# Altium footprint library con-samtec.PCBLIB: 805 footprints (part 35 of 55)
Each footprint in its own frame and in the unit in brackets; x right, y up, seen from the top. Pads: shape width x height; smd on the part's side, far side on the other; paste and mask are expansions set on the pad; w line width, h text height; cw(c..) or ccw(c..) is an arc to the next point about the centre after c.
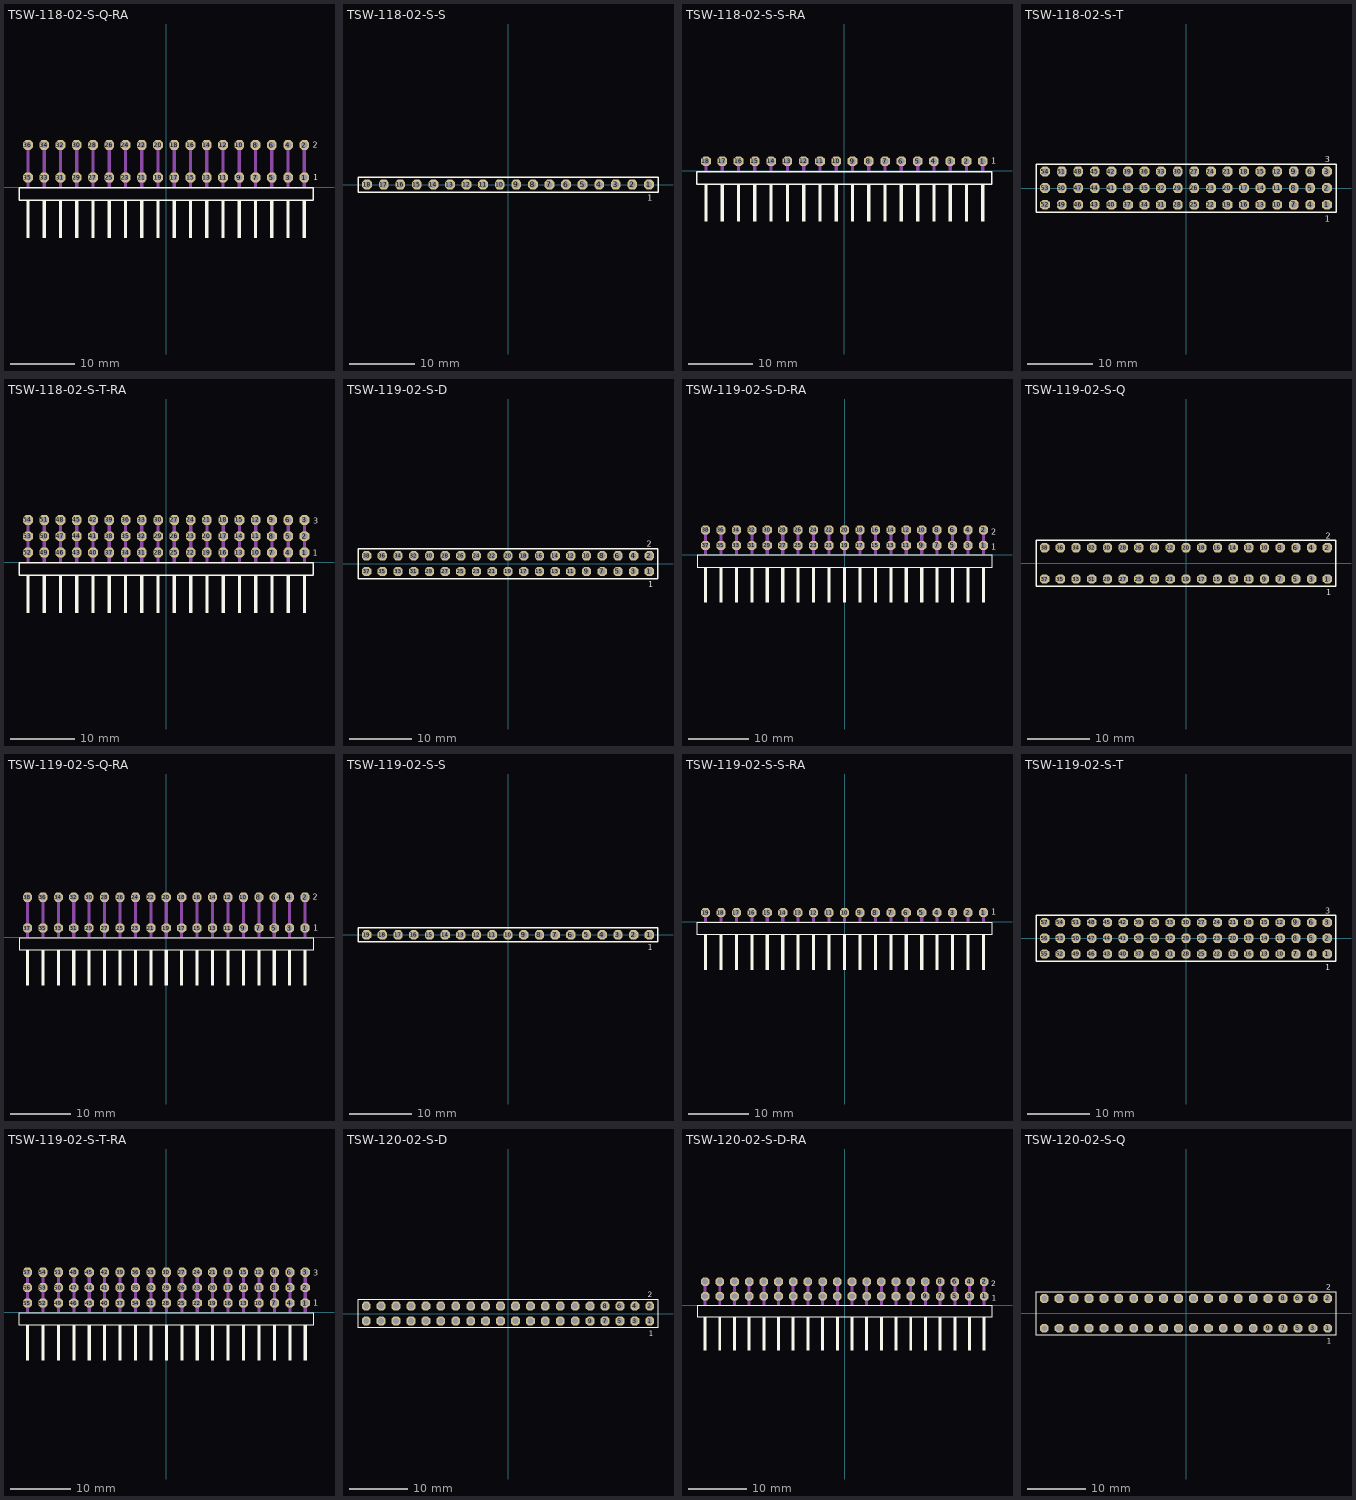
[diagram p34: the footprints below, top view; thin cyan lines are the x and y axes]

## TSW-118-02-S-Q-RA [mil]
pads (36):
  oct 59.06x59.06 hole 39.37: 1(850,60) 2(850,260) 3(750,60) 4(750,260) 5(650,60) 6(650,260) 7(550,60) 8(550,260) 9(450,60) 10(450,260) 11(350,60) 12(350,260) 13(250,60) 14(250,260) 15(150,60) 16(150,260) 17(50,60) 18(50,260) 19(-50,60) 20(-50,260) 21(-150,60) 22(-150,260) 23(-250,60) 24(-250,260) 25(-350,60) 26(-350,260) 27(-450,60) 28(-450,260) 29(-550,60) 30(-550,260) 31(-650,60) 32(-650,260) 33(-750,60) 34(-750,260) 35(-850,60) 36(-850,260)
Top Overlay:
  rectangle: -860,-310.63 -840,-80.32
  rectangle: -760,-310.63 -740,-80.32
  rectangle: -660,-310.63 -640,-80.32
  rectangle: -560,-310.63 -540,-80.32
  rectangle: -460,-310.63 -440,-80.32
  rectangle: -360,-310.63 -340,-80.32
  rectangle: -260,-310.63 -240,-80.32
  rectangle: -160,-310.63 -140,-80.32
  rectangle: -60,-310.63 -40,-80.32
  rectangle: 40,-310.63 60,-80.32
  rectangle: 140,-310.63 160,-80.32
  rectangle: 240,-310.63 260,-80.32
  rectangle: 340,-310.63 360,-80.32
  rectangle: 440,-310.63 460,-80.32
  rectangle: 540,-310.63 560,-80.32
  rectangle: 640,-310.63 660,-80.32
  rectangle: 740,-310.63 760,-80.32
  rectangle: 840,-310.63 860,-80.32
  lines w8: -905.08,-80.55 905.08,-80.55 905.08,-4.17 -905.08,-4.17 -905.08,-80.55
  text "1" at 903.54,43.31 h36.81
  text "2" at 901.18,242.72 h36.81
Mechanical 16:
  rectangle: -860,0 -840,270
  rectangle: -760,0 -740,270
  rectangle: -660,0 -640,270
  rectangle: -560,0 -540,270
  rectangle: -460,0 -440,270
  rectangle: -360,0 -340,270
  rectangle: -260,0 -240,270
  rectangle: -160,0 -140,270
  rectangle: -60,0 -40,270
  rectangle: 40,0 60,270
  rectangle: 140,0 160,270
  rectangle: 240,0 260,270
  rectangle: 340,0 360,270
  rectangle: 440,0 460,270
  rectangle: 540,0 560,270
  rectangle: 640,0 660,270
  rectangle: 740,0 760,270
  rectangle: 840,0 860,270

## TSW-118-02-S-S [mm]
pads (18):
  oct 1.5x1.5 hole 1: 1(21.59,0) 2(19.05,0) 3(16.51,0) 4(13.97,0) 5(11.43,0) 6(8.89,0) 7(6.35,0) 8(3.81,0) 9(1.27,0) 10(-1.27,0) 11(-3.81,0) 12(-6.35,0) 13(-8.89,0) 14(-11.43,0) 15(-13.97,0) 16(-16.51,0) 17(-19.05,0) 18(-21.59,0)
Top Overlay:
  lines w0.203: -22.989,-1.155 22.989,-1.155 22.989,1.155 -22.989,1.155 -22.989,-1.155
  text "1" at 21.332,-2.498 h0.94
Mechanical 16:
  rectangle: -21.94,-0.35 -21.24,0.35
  rectangle: -19.4,-0.35 -18.7,0.35
  rectangle: -16.86,-0.35 -16.16,0.35
  rectangle: -14.32,-0.35 -13.62,0.35
  rectangle: -11.78,-0.35 -11.08,0.35
  rectangle: -9.24,-0.35 -8.54,0.35
  rectangle: -6.7,-0.35 -6,0.35
  rectangle: -4.16,-0.35 -3.46,0.35
  rectangle: -1.62,-0.35 -0.92,0.35
  rectangle: 0.92,-0.35 1.62,0.35
  rectangle: 3.46,-0.35 4.16,0.35
  rectangle: 6,-0.35 6.7,0.35
  rectangle: 8.54,-0.35 9.24,0.35
  rectangle: 11.08,-0.35 11.78,0.35
  rectangle: 13.62,-0.35 14.32,0.35
  rectangle: 16.16,-0.35 16.86,0.35
  rectangle: 18.7,-0.35 19.4,0.35
  rectangle: 21.24,-0.35 21.94,0.35

## TSW-118-02-S-S-RA [mil]
pads (18):
  oct 59.06x59.06 hole 39.37: 1(850,60) 2(750,60) 3(650,60) 4(550,60) 5(450,60) 6(350,60) 7(250,60) 8(150,60) 9(50,60) 10(-50,60) 11(-150,60) 12(-250,60) 13(-350,60) 14(-450,60) 15(-550,60) 16(-650,60) 17(-750,60) 18(-850,60)
Top Overlay:
  rectangle: -860,-310.63 -840,-80.32
  rectangle: -760,-310.63 -740,-80.32
  rectangle: -660,-310.63 -640,-80.32
  rectangle: -560,-310.63 -540,-80.32
  rectangle: -460,-310.63 -440,-80.32
  rectangle: -360,-310.63 -340,-80.32
  rectangle: -260,-310.63 -240,-80.32
  rectangle: -160,-310.63 -140,-80.32
  rectangle: -60,-310.63 -40,-80.32
  rectangle: 40,-310.63 60,-80.32
  rectangle: 140,-310.63 160,-80.32
  rectangle: 240,-310.63 260,-80.32
  rectangle: 340,-310.63 360,-80.32
  rectangle: 440,-310.63 460,-80.32
  rectangle: 540,-310.63 560,-80.32
  rectangle: 640,-310.63 660,-80.32
  rectangle: 740,-310.63 760,-80.32
  rectangle: 840,-310.63 860,-80.32
  lines w8: -905.08,-80.55 905.08,-80.55 905.08,-4.17 -905.08,-4.17 -905.08,-80.55
  text "1" at 900.47,45.35 h36.81
Mechanical 16:
  rectangle: -860,0 -840,70
  rectangle: -760,0 -740,70
  rectangle: -660,0 -640,70
  rectangle: -560,0 -540,70
  rectangle: -460,0 -440,70
  rectangle: -360,0 -340,70
  rectangle: -260,0 -240,70
  rectangle: -160,0 -140,70
  rectangle: -60,0 -40,70
  rectangle: 40,0 60,70
  rectangle: 140,0 160,70
  rectangle: 240,0 260,70
  rectangle: 340,0 360,70
  rectangle: 440,0 460,70
  rectangle: 540,0 560,70
  rectangle: 640,0 660,70
  rectangle: 740,0 760,70
  rectangle: 840,0 860,70

## TSW-118-02-S-T [mm]
pads (54):
  oct 1.5x1.5 hole 1: 1(21.59,-2.54) 2(21.59,0) 3(21.59,2.54) 4(19.05,-2.54) 5(19.05,0) 6(19.05,2.54) 7(16.51,-2.54) 8(16.51,0) 9(16.51,2.54) 10(13.97,-2.54) 11(13.97,0) 12(13.97,2.54) 13(11.43,-2.54) 14(11.43,0) 15(11.43,2.54) 16(8.89,-2.54) 17(8.89,0) 18(8.89,2.54) 19(6.35,-2.54) 20(6.35,0) 21(6.35,2.54) 22(3.81,-2.54) 23(3.81,0) 24(3.81,2.54) 25(1.27,-2.54) 26(1.27,0) 27(1.27,2.54) 28(-1.27,-2.54) 29(-1.27,0) 30(-1.27,2.54) 31(-3.81,-2.54) 32(-3.81,0) 33(-3.81,2.54) 34(-6.35,-2.54) 35(-6.35,0) 36(-6.35,2.54) 37(-8.89,-2.54) 38(-8.89,0) 39(-8.89,2.54) 40(-11.43,-2.54) 41(-11.43,0) 42(-11.43,2.54) 43(-13.97,-2.54) 44(-13.97,0) 45(-13.97,2.54) 46(-16.51,-2.54) 47(-16.51,0) 48(-16.51,2.54) 49(-19.05,-2.54) 50(-19.05,0) 51(-19.05,2.54) 52(-21.59,-2.54) 53(-21.59,0) 54(-21.59,2.54)
Top Overlay:
  lines w0.203: -22.989,-3.695 22.989,-3.695 22.989,3.695 -22.989,3.695 -22.989,-3.695
  text "1" at 21.282,-5.188 h0.94
  text "3" at 21.278,3.989 h0.94
Mechanical 16:
  rectangle: -21.94,-2.89 -21.24,-2.19
  rectangle: -21.94,-0.35 -21.24,0.35
  rectangle: -21.94,2.19 -21.24,2.89
  rectangle: -19.4,-2.89 -18.7,-2.19
  rectangle: -19.4,-0.35 -18.7,0.35
  rectangle: -19.4,2.19 -18.7,2.89
  rectangle: -16.86,-2.89 -16.16,-2.19
  rectangle: -16.86,-0.35 -16.16,0.35
  rectangle: -16.86,2.19 -16.16,2.89
  rectangle: -14.32,-2.89 -13.62,-2.19
  rectangle: -14.32,-0.35 -13.62,0.35
  rectangle: -14.32,2.19 -13.62,2.89
  rectangle: -11.78,-2.89 -11.08,-2.19
  rectangle: -11.78,-0.35 -11.08,0.35
  rectangle: -11.78,2.19 -11.08,2.89
  rectangle: -9.24,-2.89 -8.54,-2.19
  rectangle: -9.24,-0.35 -8.54,0.35
  rectangle: -9.24,2.19 -8.54,2.89
  rectangle: -6.7,-2.89 -6,-2.19
  rectangle: -6.7,-0.35 -6,0.35
  rectangle: -6.7,2.19 -6,2.89
  rectangle: -4.16,-2.89 -3.46,-2.19
  rectangle: -4.16,-0.35 -3.46,0.35
  rectangle: -4.16,2.19 -3.46,2.89
  rectangle: -1.62,-2.89 -0.92,-2.19
  rectangle: -1.62,-0.35 -0.92,0.35
  rectangle: -1.62,2.19 -0.92,2.89
  rectangle: 0.92,-2.89 1.62,-2.19
  rectangle: 0.92,-0.35 1.62,0.35
  rectangle: 0.92,2.19 1.62,2.89
  rectangle: 3.46,-2.89 4.16,-2.19
  rectangle: 3.46,-0.35 4.16,0.35
  rectangle: 3.46,2.19 4.16,2.89
  rectangle: 6,-2.89 6.7,-2.19
  rectangle: 6,-0.35 6.7,0.35
  rectangle: 6,2.19 6.7,2.89
  rectangle: 8.54,-2.89 9.24,-2.19
  rectangle: 8.54,-0.35 9.24,0.35
  rectangle: 8.54,2.19 9.24,2.89
  rectangle: 11.08,-2.89 11.78,-2.19
  rectangle: 11.08,-0.35 11.78,0.35
  rectangle: 11.08,2.19 11.78,2.89
  rectangle: 13.62,-2.89 14.32,-2.19
  rectangle: 13.62,-0.35 14.32,0.35
  rectangle: 13.62,2.19 14.32,2.89
  rectangle: 16.16,-2.89 16.86,-2.19
  rectangle: 16.16,-0.35 16.86,0.35
  rectangle: 16.16,2.19 16.86,2.89
  rectangle: 18.7,-2.89 19.4,-2.19
  rectangle: 18.7,-0.35 19.4,0.35
  rectangle: 18.7,2.19 19.4,2.89
  rectangle: 21.24,-2.89 21.94,-2.19
  rectangle: 21.24,-0.35 21.94,0.35
  rectangle: 21.24,2.19 21.94,2.89

## TSW-118-02-S-T-RA [mil]
pads (54):
  oct 59.06x59.06 hole 39.37: 1(850,60) 2(850,160) 3(850,260) 4(750,60) 5(750,160) 6(750,260) 7(650,60) 8(650,160) 9(650,260) 10(550,60) 11(550,160) 12(550,260) 13(450,60) 14(450,160) 15(450,260) 16(350,60) 17(350,160) 18(350,260) 19(250,60) 20(250,160) 21(250,260) 22(150,60) 23(150,160) 24(150,260) 25(50,60) 26(50,160) 27(50,260) 28(-50,60) 29(-50,160) 30(-50,260) 31(-150,60) 32(-150,160) 33(-150,260) 34(-250,60) 35(-250,160) 36(-250,260) 37(-350,60) 38(-350,160) 39(-350,260) 40(-450,60) 41(-450,160) 42(-450,260) 43(-550,60) 44(-550,160) 45(-550,260) 46(-650,60) 47(-650,160) 48(-650,260) 49(-750,60) 50(-750,160) 51(-750,260) 52(-850,60) 53(-850,160) 54(-850,260)
Top Overlay:
  rectangle: -860,-310.63 -840,-80.32
  rectangle: -760,-310.63 -740,-80.32
  rectangle: -660,-310.63 -640,-80.32
  rectangle: -560,-310.63 -540,-80.32
  rectangle: -460,-310.63 -440,-80.32
  rectangle: -360,-310.63 -340,-80.32
  rectangle: -260,-310.63 -240,-80.32
  rectangle: -160,-310.63 -140,-80.32
  rectangle: -60,-310.63 -40,-80.32
  rectangle: 40,-310.63 60,-80.32
  rectangle: 140,-310.63 160,-80.32
  rectangle: 240,-310.63 260,-80.32
  rectangle: 340,-310.63 360,-80.32
  rectangle: 440,-310.63 460,-80.32
  rectangle: 540,-310.63 560,-80.32
  rectangle: 640,-310.63 660,-80.32
  rectangle: 740,-310.63 760,-80.32
  rectangle: 840,-310.63 860,-80.32
  lines w8: -905.08,-80.55 905.08,-80.55 905.08,-4.17 -905.08,-4.17 -905.08,-80.55
  text "1" at 901.57,41.34 h36.81
  text "3" at 902.17,236.81 h36.81
Mechanical 16:
  rectangle: -860,0 -840,270
  rectangle: -760,0 -740,270
  rectangle: -660,0 -640,270
  rectangle: -560,0 -540,270
  rectangle: -460,0 -440,270
  rectangle: -360,0 -340,270
  rectangle: -260,0 -240,270
  rectangle: -160,0 -140,270
  rectangle: -60,0 -40,270
  rectangle: 40,0 60,270
  rectangle: 140,0 160,270
  rectangle: 240,0 260,270
  rectangle: 340,0 360,270
  rectangle: 440,0 460,270
  rectangle: 540,0 560,270
  rectangle: 640,0 660,270
  rectangle: 740,0 760,270
  rectangle: 840,0 860,270

## TSW-119-02-S-D [mm]
pads (38):
  oct 1.5x1.5 hole 1: 1(22.86,-1.27) 2(22.86,1.27) 3(20.32,-1.27) 4(20.32,1.27) 5(17.78,-1.27) 6(17.78,1.27) 7(15.24,-1.27) 8(15.24,1.27) 9(12.7,-1.27) 10(12.7,1.27) 11(10.16,-1.27) 12(10.16,1.27) 13(7.62,-1.27) 14(7.62,1.27) 15(5.08,-1.27) 16(5.08,1.27) 17(2.54,-1.27) 18(2.54,1.27) 19(0,-1.27) 20(0,1.27) 21(-2.54,-1.27) 22(-2.54,1.27) 23(-5.08,-1.27) 24(-5.08,1.27) 25(-7.62,-1.27) 26(-7.62,1.27) 27(-10.16,-1.27) 28(-10.16,1.27) 29(-12.7,-1.27) 30(-12.7,1.27) 31(-15.24,-1.27) 32(-15.24,1.27) 33(-17.78,-1.27) 34(-17.78,1.27) 35(-20.32,-1.27) 36(-20.32,1.27) 37(-22.86,-1.27) 38(-22.86,1.27)
Top Overlay:
  lines w0.203: -24.259,-2.425 24.259,-2.425 24.259,2.425 -24.259,2.425 -24.259,-2.425
  text "1" at 22.652,-3.818 h0.94
  text "2" at 22.477,2.744 h0.94
Mechanical 16:
  rectangle: -23.21,-1.62 -22.51,-0.92
  rectangle: -23.21,0.92 -22.51,1.62
  rectangle: -20.67,-1.62 -19.97,-0.92
  rectangle: -20.67,0.92 -19.97,1.62
  rectangle: -18.13,-1.62 -17.43,-0.92
  rectangle: -18.13,0.92 -17.43,1.62
  rectangle: -15.59,-1.62 -14.89,-0.92
  rectangle: -15.59,0.92 -14.89,1.62
  rectangle: -13.05,-1.62 -12.35,-0.92
  rectangle: -13.05,0.92 -12.35,1.62
  rectangle: -10.51,-1.62 -9.81,-0.92
  rectangle: -10.51,0.92 -9.81,1.62
  rectangle: -7.97,-1.62 -7.27,-0.92
  rectangle: -7.97,0.92 -7.27,1.62
  rectangle: -5.43,-1.62 -4.73,-0.92
  rectangle: -5.43,0.92 -4.73,1.62
  rectangle: -2.89,-1.62 -2.19,-0.92
  rectangle: -2.89,0.92 -2.19,1.62
  rectangle: -0.35,-1.62 0.35,-0.92
  rectangle: -0.35,0.92 0.35,1.62
  rectangle: 2.19,-1.62 2.89,-0.92
  rectangle: 2.19,0.92 2.89,1.62
  rectangle: 4.73,-1.62 5.43,-0.92
  rectangle: 4.73,0.92 5.43,1.62
  rectangle: 7.27,-1.62 7.97,-0.92
  rectangle: 7.27,0.92 7.97,1.62
  rectangle: 9.81,-1.62 10.51,-0.92
  rectangle: 9.81,0.92 10.51,1.62
  rectangle: 12.35,-1.62 13.05,-0.92
  rectangle: 12.35,0.92 13.05,1.62
  rectangle: 14.89,-1.62 15.59,-0.92
  rectangle: 14.89,0.92 15.59,1.62
  rectangle: 17.43,-1.62 18.13,-0.92
  rectangle: 17.43,0.92 18.13,1.62
  rectangle: 19.97,-1.62 20.67,-0.92
  rectangle: 19.97,0.92 20.67,1.62
  rectangle: 22.51,-1.62 23.21,-0.92
  rectangle: 22.51,0.92 23.21,1.62

## TSW-119-02-S-D-RA [mil]
pads (38):
  oct 59.06x59.06 hole 39.37: 1(900,60) 2(900,160) 3(800,60) 4(800,160) 5(700,60) 6(700,160) 7(600,60) 8(600,160) 9(500,60) 10(500,160) 11(400,60) 12(400,160) 13(300,60) 14(300,160) 15(200,60) 16(200,160) 17(100,60) 18(100,160) 19(0,60) 20(0,160) 21(-100,60) 22(-100,160) 23(-200,60) 24(-200,160) 25(-300,60) 26(-300,160) 27(-400,60) 28(-400,160) 29(-500,60) 30(-500,160) 31(-600,60) 32(-600,160) 33(-700,60) 34(-700,160) 35(-800,60) 36(-800,160) 37(-900,60) 38(-900,160)
Top Overlay:
  rectangle: -910,-310.63 -890,-80.32
  rectangle: -810,-310.63 -790,-80.32
  rectangle: -710,-310.63 -690,-80.32
  rectangle: -610,-310.63 -590,-80.32
  rectangle: -510,-310.63 -490,-80.32
  rectangle: -410,-310.63 -390,-80.32
  rectangle: -310,-310.63 -290,-80.32
  rectangle: -210,-310.63 -190,-80.32
  rectangle: -110,-310.63 -90,-80.32
  rectangle: -10,-310.63 10,-80.32
  rectangle: 90,-310.63 110,-80.32
  rectangle: 190,-310.63 210,-80.32
  rectangle: 290,-310.63 310,-80.32
  rectangle: 390,-310.63 410,-80.32
  rectangle: 490,-310.63 510,-80.32
  rectangle: 590,-310.63 610,-80.32
  rectangle: 690,-310.63 710,-80.32
  rectangle: 790,-310.63 810,-80.32
  rectangle: 890,-310.63 910,-80.32
  lines w8: -955.08,-80.55 955.08,-80.55 955.08,-4.17 -955.08,-4.17 -955.08,-80.55
  text "1" at 950.59,30.51 h36.81
  text "2" at 949.21,129.53 h36.81
Mechanical 16:
  rectangle: -910,0 -890,170
  rectangle: -810,0 -790,170
  rectangle: -710,0 -690,170
  rectangle: -610,0 -590,170
  rectangle: -510,0 -490,170
  rectangle: -410,0 -390,170
  rectangle: -310,0 -290,170
  rectangle: -210,0 -190,170
  rectangle: -110,0 -90,170
  rectangle: -10,0 10,170
  rectangle: 90,0 110,170
  rectangle: 190,0 210,170
  rectangle: 290,0 310,170
  rectangle: 390,0 410,170
  rectangle: 490,0 510,170
  rectangle: 590,0 610,170
  rectangle: 690,0 710,170
  rectangle: 790,0 810,170
  rectangle: 890,0 910,170

## TSW-119-02-S-Q [mm]
pads (38):
  oct 1.5x1.5 hole 1: 1(22.86,-2.54) 2(22.86,2.54) 3(20.32,-2.54) 4(20.32,2.54) 5(17.78,-2.54) 6(17.78,2.54) 7(15.24,-2.54) 8(15.24,2.54) 9(12.7,-2.54) 10(12.7,2.54) 11(10.16,-2.54) 12(10.16,2.54) 13(7.62,-2.54) 14(7.62,2.54) 15(5.08,-2.54) 16(5.08,2.54) 17(2.54,-2.54) 18(2.54,2.54) 19(0,-2.54) 20(0,2.54) 21(-2.54,-2.54) 22(-2.54,2.54) 23(-5.08,-2.54) 24(-5.08,2.54) 25(-7.62,-2.54) 26(-7.62,2.54) 27(-10.16,-2.54) 28(-10.16,2.54) 29(-12.7,-2.54) 30(-12.7,2.54) 31(-15.24,-2.54) 32(-15.24,2.54) 33(-17.78,-2.54) 34(-17.78,2.54) 35(-20.32,-2.54) 36(-20.32,2.54) 37(-22.86,-2.54) 38(-22.86,2.54)
Top Overlay:
  lines w0.203: -24.259,-3.695 24.259,-3.695 24.259,3.695 -24.259,3.695 -24.259,-3.695
  text "1" at 22.702,-5.138 h0.94
  text "2" at 22.602,3.989 h0.94
Mechanical 16:
  rectangle: -23.21,-2.89 -22.51,-2.19
  rectangle: -23.21,2.19 -22.51,2.89
  rectangle: -20.67,-2.89 -19.97,-2.19
  rectangle: -20.67,2.19 -19.97,2.89
  rectangle: -18.13,-2.89 -17.43,-2.19
  rectangle: -18.13,2.19 -17.43,2.89
  rectangle: -15.59,-2.89 -14.89,-2.19
  rectangle: -15.59,2.19 -14.89,2.89
  rectangle: -13.05,-2.89 -12.35,-2.19
  rectangle: -13.05,2.19 -12.35,2.89
  rectangle: -10.51,-2.89 -9.81,-2.19
  rectangle: -10.51,2.19 -9.81,2.89
  rectangle: -7.97,-2.89 -7.27,-2.19
  rectangle: -7.97,2.19 -7.27,2.89
  rectangle: -5.43,-2.89 -4.73,-2.19
  rectangle: -5.43,2.19 -4.73,2.89
  rectangle: -2.89,-2.89 -2.19,-2.19
  rectangle: -2.89,2.19 -2.19,2.89
  rectangle: -0.35,-2.89 0.35,-2.19
  rectangle: -0.35,2.19 0.35,2.89
  rectangle: 2.19,-2.89 2.89,-2.19
  rectangle: 2.19,2.19 2.89,2.89
  rectangle: 4.73,-2.89 5.43,-2.19
  rectangle: 4.73,2.19 5.43,2.89
  rectangle: 7.27,-2.89 7.97,-2.19
  rectangle: 7.27,2.19 7.97,2.89
  rectangle: 9.81,-2.89 10.51,-2.19
  rectangle: 9.81,2.19 10.51,2.89
  rectangle: 12.35,-2.89 13.05,-2.19
  rectangle: 12.35,2.19 13.05,2.89
  rectangle: 14.89,-2.89 15.59,-2.19
  rectangle: 14.89,2.19 15.59,2.89
  rectangle: 17.43,-2.89 18.13,-2.19
  rectangle: 17.43,2.19 18.13,2.89
  rectangle: 19.97,-2.89 20.67,-2.19
  rectangle: 19.97,2.19 20.67,2.89
  rectangle: 22.51,-2.89 23.21,-2.19
  rectangle: 22.51,2.19 23.21,2.89

## TSW-119-02-S-Q-RA [mil]
pads (38):
  oct 59.06x59.06 hole 39.37: 1(900,60) 2(900,260) 3(800,60) 4(800,260) 5(700,60) 6(700,260) 7(600,60) 8(600,260) 9(500,60) 10(500,260) 11(400,60) 12(400,260) 13(300,60) 14(300,260) 15(200,60) 16(200,260) 17(100,60) 18(100,260) 19(0,60) 20(0,260) 21(-100,60) 22(-100,260) 23(-200,60) 24(-200,260) 25(-300,60) 26(-300,260) 27(-400,60) 28(-400,260) 29(-500,60) 30(-500,260) 31(-600,60) 32(-600,260) 33(-700,60) 34(-700,260) 35(-800,60) 36(-800,260) 37(-900,60) 38(-900,260)
Top Overlay:
  rectangle: -910,-310.63 -890,-80.32
  rectangle: -810,-310.63 -790,-80.32
  rectangle: -710,-310.63 -690,-80.32
  rectangle: -610,-310.63 -590,-80.32
  rectangle: -510,-310.63 -490,-80.32
  rectangle: -410,-310.63 -390,-80.32
  rectangle: -310,-310.63 -290,-80.32
  rectangle: -210,-310.63 -190,-80.32
  rectangle: -110,-310.63 -90,-80.32
  rectangle: -10,-310.63 10,-80.32
  rectangle: 90,-310.63 110,-80.32
  rectangle: 190,-310.63 210,-80.32
  rectangle: 290,-310.63 310,-80.32
  rectangle: 390,-310.63 410,-80.32
  rectangle: 490,-310.63 510,-80.32
  rectangle: 590,-310.63 610,-80.32
  rectangle: 690,-310.63 710,-80.32
  rectangle: 790,-310.63 810,-80.32
  rectangle: 890,-310.63 910,-80.32
  lines w8: -955.08,-80.55 955.08,-80.55 955.08,-4.17 -955.08,-4.17 -955.08,-80.55
  text "1" at 953.54,43.31 h36.81
  text "2" at 951.18,242.72 h36.81
Mechanical 16:
  rectangle: -910,0 -890,270
  rectangle: -810,0 -790,270
  rectangle: -710,0 -690,270
  rectangle: -610,0 -590,270
  rectangle: -510,0 -490,270
  rectangle: -410,0 -390,270
  rectangle: -310,0 -290,270
  rectangle: -210,0 -190,270
  rectangle: -110,0 -90,270
  rectangle: -10,0 10,270
  rectangle: 90,0 110,270
  rectangle: 190,0 210,270
  rectangle: 290,0 310,270
  rectangle: 390,0 410,270
  rectangle: 490,0 510,270
  rectangle: 590,0 610,270
  rectangle: 690,0 710,270
  rectangle: 790,0 810,270
  rectangle: 890,0 910,270

## TSW-119-02-S-S [mm]
pads (19):
  oct 1.5x1.5 hole 1: 1(22.86,0) 2(20.32,0) 3(17.78,0) 4(15.24,0) 5(12.7,0) 6(10.16,0) 7(7.62,0) 8(5.08,0) 9(2.54,0) 10(0,0) 11(-2.54,0) 12(-5.08,0) 13(-7.62,0) 14(-10.16,0) 15(-12.7,0) 16(-15.24,0) 17(-17.78,0) 18(-20.32,0) 19(-22.86,0)
Top Overlay:
  lines w0.203: -24.259,-1.155 24.259,-1.155 24.259,1.155 -24.259,1.155 -24.259,-1.155
  text "1" at 22.602,-2.498 h0.94
Mechanical 16:
  rectangle: -23.21,-0.35 -22.51,0.35
  rectangle: -20.67,-0.35 -19.97,0.35
  rectangle: -18.13,-0.35 -17.43,0.35
  rectangle: -15.59,-0.35 -14.89,0.35
  rectangle: -13.05,-0.35 -12.35,0.35
  rectangle: -10.51,-0.35 -9.81,0.35
  rectangle: -7.97,-0.35 -7.27,0.35
  rectangle: -5.43,-0.35 -4.73,0.35
  rectangle: -2.89,-0.35 -2.19,0.35
  rectangle: -0.35,-0.35 0.35,0.35
  rectangle: 2.19,-0.35 2.89,0.35
  rectangle: 4.73,-0.35 5.43,0.35
  rectangle: 7.27,-0.35 7.97,0.35
  rectangle: 9.81,-0.35 10.51,0.35
  rectangle: 12.35,-0.35 13.05,0.35
  rectangle: 14.89,-0.35 15.59,0.35
  rectangle: 17.43,-0.35 18.13,0.35
  rectangle: 19.97,-0.35 20.67,0.35
  rectangle: 22.51,-0.35 23.21,0.35

## TSW-119-02-S-S-RA [mil]
pads (19):
  oct 59.06x59.06 hole 39.37: 1(900,60) 2(800,60) 3(700,60) 4(600,60) 5(500,60) 6(400,60) 7(300,60) 8(200,60) 9(100,60) 10(0,60) 11(-100,60) 12(-200,60) 13(-300,60) 14(-400,60) 15(-500,60) 16(-600,60) 17(-700,60) 18(-800,60) 19(-900,60)
Top Overlay:
  rectangle: -910,-310.63 -890,-80.32
  rectangle: -810,-310.63 -790,-80.32
  rectangle: -710,-310.63 -690,-80.32
  rectangle: -610,-310.63 -590,-80.32
  rectangle: -510,-310.63 -490,-80.32
  rectangle: -410,-310.63 -390,-80.32
  rectangle: -310,-310.63 -290,-80.32
  rectangle: -210,-310.63 -190,-80.32
  rectangle: -110,-310.63 -90,-80.32
  rectangle: -10,-310.63 10,-80.32
  rectangle: 90,-310.63 110,-80.32
  rectangle: 190,-310.63 210,-80.32
  rectangle: 290,-310.63 310,-80.32
  rectangle: 390,-310.63 410,-80.32
  rectangle: 490,-310.63 510,-80.32
  rectangle: 590,-310.63 610,-80.32
  rectangle: 690,-310.63 710,-80.32
  rectangle: 790,-310.63 810,-80.32
  rectangle: 890,-310.63 910,-80.32
  lines w8: -955.08,-80.55 955.08,-80.55 955.08,-4.17 -955.08,-4.17 -955.08,-80.55
  text "1" at 950.47,45.35 h36.81
Mechanical 16:
  rectangle: -910,0 -890,70
  rectangle: -810,0 -790,70
  rectangle: -710,0 -690,70
  rectangle: -610,0 -590,70
  rectangle: -510,0 -490,70
  rectangle: -410,0 -390,70
  rectangle: -310,0 -290,70
  rectangle: -210,0 -190,70
  rectangle: -110,0 -90,70
  rectangle: -10,0 10,70
  rectangle: 90,0 110,70
  rectangle: 190,0 210,70
  rectangle: 290,0 310,70
  rectangle: 390,0 410,70
  rectangle: 490,0 510,70
  rectangle: 590,0 610,70
  rectangle: 690,0 710,70
  rectangle: 790,0 810,70
  rectangle: 890,0 910,70

## TSW-119-02-S-T [mm]
pads (57):
  oct 1.5x1.5 hole 1: 1(22.86,-2.54) 2(22.86,0) 3(22.86,2.54) 4(20.32,-2.54) 5(20.32,0) 6(20.32,2.54) 7(17.78,-2.54) 8(17.78,0) 9(17.78,2.54) 10(15.24,-2.54) 11(15.24,0) 12(15.24,2.54) 13(12.7,-2.54) 14(12.7,0) 15(12.7,2.54) 16(10.16,-2.54) 17(10.16,0) 18(10.16,2.54) 19(7.62,-2.54) 20(7.62,0) 21(7.62,2.54) 22(5.08,-2.54) 23(5.08,0) 24(5.08,2.54) 25(2.54,-2.54) 26(2.54,0) 27(2.54,2.54) 28(0,-2.54) 29(0,0) 30(0,2.54) 31(-2.54,-2.54) 32(-2.54,0) 33(-2.54,2.54) 34(-5.08,-2.54) 35(-5.08,0) 36(-5.08,2.54) 37(-7.62,-2.54) 38(-7.62,0) 39(-7.62,2.54) 40(-10.16,-2.54) 41(-10.16,0) 42(-10.16,2.54) 43(-12.7,-2.54) 44(-12.7,0) 45(-12.7,2.54) 46(-15.24,-2.54) 47(-15.24,0) 48(-15.24,2.54) 49(-17.78,-2.54) 50(-17.78,0) 51(-17.78,2.54) 52(-20.32,-2.54) 53(-20.32,0) 54(-20.32,2.54) 55(-22.86,-2.54) 56(-22.86,0) 57(-22.86,2.54)
Top Overlay:
  lines w0.203: -24.259,-3.695 24.259,-3.695 24.259,3.695 -24.259,3.695 -24.259,-3.695
  text "1" at 22.552,-5.188 h0.94
  text "3" at 22.548,3.989 h0.94
Mechanical 16:
  rectangle: -23.21,-2.89 -22.51,-2.19
  rectangle: -23.21,-0.35 -22.51,0.35
  rectangle: -23.21,2.19 -22.51,2.89
  rectangle: -20.67,-2.89 -19.97,-2.19
  rectangle: -20.67,-0.35 -19.97,0.35
  rectangle: -20.67,2.19 -19.97,2.89
  rectangle: -18.13,-2.89 -17.43,-2.19
  rectangle: -18.13,-0.35 -17.43,0.35
  rectangle: -18.13,2.19 -17.43,2.89
  rectangle: -15.59,-2.89 -14.89,-2.19
  rectangle: -15.59,-0.35 -14.89,0.35
  rectangle: -15.59,2.19 -14.89,2.89
  rectangle: -13.05,-2.89 -12.35,-2.19
  rectangle: -13.05,-0.35 -12.35,0.35
  rectangle: -13.05,2.19 -12.35,2.89
  rectangle: -10.51,-2.89 -9.81,-2.19
  rectangle: -10.51,-0.35 -9.81,0.35
  rectangle: -10.51,2.19 -9.81,2.89
  rectangle: -7.97,-2.89 -7.27,-2.19
  rectangle: -7.97,-0.35 -7.27,0.35
  rectangle: -7.97,2.19 -7.27,2.89
  rectangle: -5.43,-2.89 -4.73,-2.19
  rectangle: -5.43,-0.35 -4.73,0.35
  rectangle: -5.43,2.19 -4.73,2.89
  rectangle: -2.89,-2.89 -2.19,-2.19
  rectangle: -2.89,-0.35 -2.19,0.35
  rectangle: -2.89,2.19 -2.19,2.89
  rectangle: -0.35,-2.89 0.35,-2.19
  rectangle: -0.35,-0.35 0.35,0.35
  rectangle: -0.35,2.19 0.35,2.89
  rectangle: 2.19,-2.89 2.89,-2.19
  rectangle: 2.19,-0.35 2.89,0.35
  rectangle: 2.19,2.19 2.89,2.89
  rectangle: 4.73,-2.89 5.43,-2.19
  rectangle: 4.73,-0.35 5.43,0.35
  rectangle: 4.73,2.19 5.43,2.89
  rectangle: 7.27,-2.89 7.97,-2.19
  rectangle: 7.27,-0.35 7.97,0.35
  rectangle: 7.27,2.19 7.97,2.89
  rectangle: 9.81,-2.89 10.51,-2.19
  rectangle: 9.81,-0.35 10.51,0.35
  rectangle: 9.81,2.19 10.51,2.89
  rectangle: 12.35,-2.89 13.05,-2.19
  rectangle: 12.35,-0.35 13.05,0.35
  rectangle: 12.35,2.19 13.05,2.89
  rectangle: 14.89,-2.89 15.59,-2.19
  rectangle: 14.89,-0.35 15.59,0.35
  rectangle: 14.89,2.19 15.59,2.89
  rectangle: 17.43,-2.89 18.13,-2.19
  rectangle: 17.43,-0.35 18.13,0.35
  rectangle: 17.43,2.19 18.13,2.89
  rectangle: 19.97,-2.89 20.67,-2.19
  rectangle: 19.97,-0.35 20.67,0.35
  rectangle: 19.97,2.19 20.67,2.89
  rectangle: 22.51,-2.89 23.21,-2.19
  rectangle: 22.51,-0.35 23.21,0.35
  rectangle: 22.51,2.19 23.21,2.89

## TSW-119-02-S-T-RA [mil]
pads (57):
  oct 59.06x59.06 hole 39.37: 1(900,60) 2(900,160) 3(900,260) 4(800,60) 5(800,160) 6(800,260) 7(700,60) 8(700,160) 9(700,260) 10(600,60) 11(600,160) 12(600,260) 13(500,60) 14(500,160) 15(500,260) 16(400,60) 17(400,160) 18(400,260) 19(300,60) 20(300,160) 21(300,260) 22(200,60) 23(200,160) 24(200,260) 25(100,60) 26(100,160) 27(100,260) 28(0,60) 29(0,160) 30(0,260) 31(-100,60) 32(-100,160) 33(-100,260) 34(-200,60) 35(-200,160) 36(-200,260) 37(-300,60) 38(-300,160) 39(-300,260) 40(-400,60) 41(-400,160) 42(-400,260) 43(-500,60) 44(-500,160) 45(-500,260) 46(-600,60) 47(-600,160) 48(-600,260) 49(-700,60) 50(-700,160) 51(-700,260) 52(-800,60) 53(-800,160) 54(-800,260) 55(-900,60) 56(-900,160) 57(-900,260)
Top Overlay:
  rectangle: -910,-310.63 -890,-80.32
  rectangle: -810,-310.63 -790,-80.32
  rectangle: -710,-310.63 -690,-80.32
  rectangle: -610,-310.63 -590,-80.32
  rectangle: -510,-310.63 -490,-80.32
  rectangle: -410,-310.63 -390,-80.32
  rectangle: -310,-310.63 -290,-80.32
  rectangle: -210,-310.63 -190,-80.32
  rectangle: -110,-310.63 -90,-80.32
  rectangle: -10,-310.63 10,-80.32
  rectangle: 90,-310.63 110,-80.32
  rectangle: 190,-310.63 210,-80.32
  rectangle: 290,-310.63 310,-80.32
  rectangle: 390,-310.63 410,-80.32
  rectangle: 490,-310.63 510,-80.32
  rectangle: 590,-310.63 610,-80.32
  rectangle: 690,-310.63 710,-80.32
  rectangle: 790,-310.63 810,-80.32
  rectangle: 890,-310.63 910,-80.32
  lines w8: -955.08,-80.55 955.08,-80.55 955.08,-4.17 -955.08,-4.17 -955.08,-80.55
  text "1" at 951.57,41.34 h36.81
  text "3" at 952.17,236.81 h36.81
Mechanical 16:
  rectangle: -910,0 -890,270
  rectangle: -810,0 -790,270
  rectangle: -710,0 -690,270
  rectangle: -610,0 -590,270
  rectangle: -510,0 -490,270
  rectangle: -410,0 -390,270
  rectangle: -310,0 -290,270
  rectangle: -210,0 -190,270
  rectangle: -110,0 -90,270
  rectangle: -10,0 10,270
  rectangle: 90,0 110,270
  rectangle: 190,0 210,270
  rectangle: 290,0 310,270
  rectangle: 390,0 410,270
  rectangle: 490,0 510,270
  rectangle: 590,0 610,270
  rectangle: 690,0 710,270
  rectangle: 790,0 810,270
  rectangle: 890,0 910,270

## TSW-120-02-S-D [mm]
pads (40):
  oct 1.5x1.5 hole 1: 1(24.13,-1.27) 2(24.13,1.27) 3(21.59,-1.27) 4(21.59,1.27) 5(19.05,-1.27) 6(19.05,1.27) 7(16.51,-1.27) 8(16.51,1.27) 9(13.97,-1.27) 10(13.97,1.27) 11(11.43,-1.27) 12(11.43,1.27) 13(8.89,-1.27) 14(8.89,1.27) 15(6.35,-1.27) 16(6.35,1.27) 17(3.81,-1.27) 18(3.81,1.27) 19(1.27,-1.27) 20(1.27,1.27) 21(-1.27,-1.27) 22(-1.27,1.27) 23(-3.81,-1.27) 24(-3.81,1.27) 25(-6.35,-1.27) 26(-6.35,1.27) 27(-8.89,-1.27) 28(-8.89,1.27) 29(-11.43,-1.27) 30(-11.43,1.27) 31(-13.97,-1.27) 32(-13.97,1.27) 33(-16.51,-1.27) 34(-16.51,1.27) 35(-19.05,-1.27) 36(-19.05,1.27) 37(-21.59,-1.27) 38(-21.59,1.27) 39(-24.13,-1.27) 40(-24.13,1.27)
Top Overlay:
  lines w0.203: -25.529,-2.425 25.529,-2.425 25.529,2.425 -25.529,2.425 -25.529,-2.425
  text "1" at 23.922,-3.818 h0.94
  text "2" at 23.747,2.744 h0.94
Mechanical 16:
  rectangle: -24.48,-1.62 -23.78,-0.92
  rectangle: -24.48,0.92 -23.78,1.62
  rectangle: -21.94,-1.62 -21.24,-0.92
  rectangle: -21.94,0.92 -21.24,1.62
  rectangle: -19.4,-1.62 -18.7,-0.92
  rectangle: -19.4,0.92 -18.7,1.62
  rectangle: -16.86,-1.62 -16.16,-0.92
  rectangle: -16.86,0.92 -16.16,1.62
  rectangle: -14.32,-1.62 -13.62,-0.92
  rectangle: -14.32,0.92 -13.62,1.62
  rectangle: -11.78,-1.62 -11.08,-0.92
  rectangle: -11.78,0.92 -11.08,1.62
  rectangle: -9.24,-1.62 -8.54,-0.92
  rectangle: -9.24,0.92 -8.54,1.62
  rectangle: -6.7,-1.62 -6,-0.92
  rectangle: -6.7,0.92 -6,1.62
  rectangle: -4.16,-1.62 -3.46,-0.92
  rectangle: -4.16,0.92 -3.46,1.62
  rectangle: -1.62,-1.62 -0.92,-0.92
  rectangle: -1.62,0.92 -0.92,1.62
  rectangle: 0.92,-1.62 1.62,-0.92
  rectangle: 0.92,0.92 1.62,1.62
  rectangle: 3.46,-1.62 4.16,-0.92
  rectangle: 3.46,0.92 4.16,1.62
  rectangle: 6,-1.62 6.7,-0.92
  rectangle: 6,0.92 6.7,1.62
  rectangle: 8.54,-1.62 9.24,-0.92
  rectangle: 8.54,0.92 9.24,1.62
  rectangle: 11.08,-1.62 11.78,-0.92
  rectangle: 11.08,0.92 11.78,1.62
  rectangle: 13.62,-1.62 14.32,-0.92
  rectangle: 13.62,0.92 14.32,1.62
  rectangle: 16.16,-1.62 16.86,-0.92
  rectangle: 16.16,0.92 16.86,1.62
  rectangle: 18.7,-1.62 19.4,-0.92
  rectangle: 18.7,0.92 19.4,1.62
  rectangle: 21.24,-1.62 21.94,-0.92
  rectangle: 21.24,0.92 21.94,1.62
  rectangle: 23.78,-1.62 24.48,-0.92
  rectangle: 23.78,0.92 24.48,1.62

## TSW-120-02-S-D-RA [mil]
pads (40):
  oct 59.06x59.06 hole 39.37: 1(950,60) 2(950,160) 3(850,60) 4(850,160) 5(750,60) 6(750,160) 7(650,60) 8(650,160) 9(550,60) 10(550,160) 11(450,60) 12(450,160) 13(350,60) 14(350,160) 15(250,60) 16(250,160) 17(150,60) 18(150,160) 19(50,60) 20(50,160) 21(-50,60) 22(-50,160) 23(-150,60) 24(-150,160) 25(-250,60) 26(-250,160) 27(-350,60) 28(-350,160) 29(-450,60) 30(-450,160) 31(-550,60) 32(-550,160) 33(-650,60) 34(-650,160) 35(-750,60) 36(-750,160) 37(-850,60) 38(-850,160) 39(-950,60) 40(-950,160)
Top Overlay:
  rectangle: -960,-310.63 -940,-80.32
  rectangle: -860,-310.63 -840,-80.32
  rectangle: -760,-310.63 -740,-80.32
  rectangle: -660,-310.63 -640,-80.32
  rectangle: -560,-310.63 -540,-80.32
  rectangle: -460,-310.63 -440,-80.32
  rectangle: -360,-310.63 -340,-80.32
  rectangle: -260,-310.63 -240,-80.32
  rectangle: -160,-310.63 -140,-80.32
  rectangle: -60,-310.63 -40,-80.32
  rectangle: 40,-310.63 60,-80.32
  rectangle: 140,-310.63 160,-80.32
  rectangle: 240,-310.63 260,-80.32
  rectangle: 340,-310.63 360,-80.32
  rectangle: 440,-310.63 460,-80.32
  rectangle: 540,-310.63 560,-80.32
  rectangle: 640,-310.63 660,-80.32
  rectangle: 740,-310.63 760,-80.32
  rectangle: 840,-310.63 860,-80.32
  rectangle: 940,-310.63 960,-80.32
  lines w8: -1005.08,-80.55 1005.08,-80.55 1005.08,-4.17 -1005.08,-4.17 -1005.08,-80.55
  text "1" at 1000.59,30.51 h36.81
  text "2" at 999.21,129.53 h36.81
Mechanical 16:
  rectangle: -960,0 -940,170
  rectangle: -860,0 -840,170
  rectangle: -760,0 -740,170
  rectangle: -660,0 -640,170
  rectangle: -560,0 -540,170
  rectangle: -460,0 -440,170
  rectangle: -360,0 -340,170
  rectangle: -260,0 -240,170
  rectangle: -160,0 -140,170
  rectangle: -60,0 -40,170
  rectangle: 40,0 60,170
  rectangle: 140,0 160,170
  rectangle: 240,0 260,170
  rectangle: 340,0 360,170
  rectangle: 440,0 460,170
  rectangle: 540,0 560,170
  rectangle: 640,0 660,170
  rectangle: 740,0 760,170
  rectangle: 840,0 860,170
  rectangle: 940,0 960,170

## TSW-120-02-S-Q [mm]
pads (40):
  oct 1.5x1.5 hole 1: 1(24.13,-2.54) 2(24.13,2.54) 3(21.59,-2.54) 4(21.59,2.54) 5(19.05,-2.54) 6(19.05,2.54) 7(16.51,-2.54) 8(16.51,2.54) 9(13.97,-2.54) 10(13.97,2.54) 11(11.43,-2.54) 12(11.43,2.54) 13(8.89,-2.54) 14(8.89,2.54) 15(6.35,-2.54) 16(6.35,2.54) 17(3.81,-2.54) 18(3.81,2.54) 19(1.27,-2.54) 20(1.27,2.54) 21(-1.27,-2.54) 22(-1.27,2.54) 23(-3.81,-2.54) 24(-3.81,2.54) 25(-6.35,-2.54) 26(-6.35,2.54) 27(-8.89,-2.54) 28(-8.89,2.54) 29(-11.43,-2.54) 30(-11.43,2.54) 31(-13.97,-2.54) 32(-13.97,2.54) 33(-16.51,-2.54) 34(-16.51,2.54) 35(-19.05,-2.54) 36(-19.05,2.54) 37(-21.59,-2.54) 38(-21.59,2.54) 39(-24.13,-2.54) 40(-24.13,2.54)
Top Overlay:
  lines w0.203: -25.529,-3.695 25.529,-3.695 25.529,3.695 -25.529,3.695 -25.529,-3.695
  text "1" at 23.972,-5.138 h0.94
  text "2" at 23.872,3.989 h0.94
Mechanical 16:
  rectangle: -24.48,-2.89 -23.78,-2.19
  rectangle: -24.48,2.19 -23.78,2.89
  rectangle: -21.94,-2.89 -21.24,-2.19
  rectangle: -21.94,2.19 -21.24,2.89
  rectangle: -19.4,-2.89 -18.7,-2.19
  rectangle: -19.4,2.19 -18.7,2.89
  rectangle: -16.86,-2.89 -16.16,-2.19
  rectangle: -16.86,2.19 -16.16,2.89
  rectangle: -14.32,-2.89 -13.62,-2.19
  rectangle: -14.32,2.19 -13.62,2.89
  rectangle: -11.78,-2.89 -11.08,-2.19
  rectangle: -11.78,2.19 -11.08,2.89
  rectangle: -9.24,-2.89 -8.54,-2.19
  rectangle: -9.24,2.19 -8.54,2.89
  rectangle: -6.7,-2.89 -6,-2.19
  rectangle: -6.7,2.19 -6,2.89
  rectangle: -4.16,-2.89 -3.46,-2.19
  rectangle: -4.16,2.19 -3.46,2.89
  rectangle: -1.62,-2.89 -0.92,-2.19
  rectangle: -1.62,2.19 -0.92,2.89
  rectangle: 0.92,-2.89 1.62,-2.19
  rectangle: 0.92,2.19 1.62,2.89
  rectangle: 3.46,-2.89 4.16,-2.19
  rectangle: 3.46,2.19 4.16,2.89
  rectangle: 6,-2.89 6.7,-2.19
  rectangle: 6,2.19 6.7,2.89
  rectangle: 8.54,-2.89 9.24,-2.19
  rectangle: 8.54,2.19 9.24,2.89
  rectangle: 11.08,-2.89 11.78,-2.19
  rectangle: 11.08,2.19 11.78,2.89
  rectangle: 13.62,-2.89 14.32,-2.19
  rectangle: 13.62,2.19 14.32,2.89
  rectangle: 16.16,-2.89 16.86,-2.19
  rectangle: 16.16,2.19 16.86,2.89
  rectangle: 18.7,-2.89 19.4,-2.19
  rectangle: 18.7,2.19 19.4,2.89
  rectangle: 21.24,-2.89 21.94,-2.19
  rectangle: 21.24,2.19 21.94,2.89
  rectangle: 23.78,-2.89 24.48,-2.19
  rectangle: 23.78,2.19 24.48,2.89